# Altium footprint library pw.PcbLib: 210 footprints (part 5 of 14)
Each footprint in its own frame and in the unit in brackets; x right, y up, seen from the top. Pads: shape width x height; smd on the part's side, far side on the other; paste and mask are expansions set on the pad; w line width, h text height; cw(c..) or ccw(c..) is an arc to the next point about the centre after c.
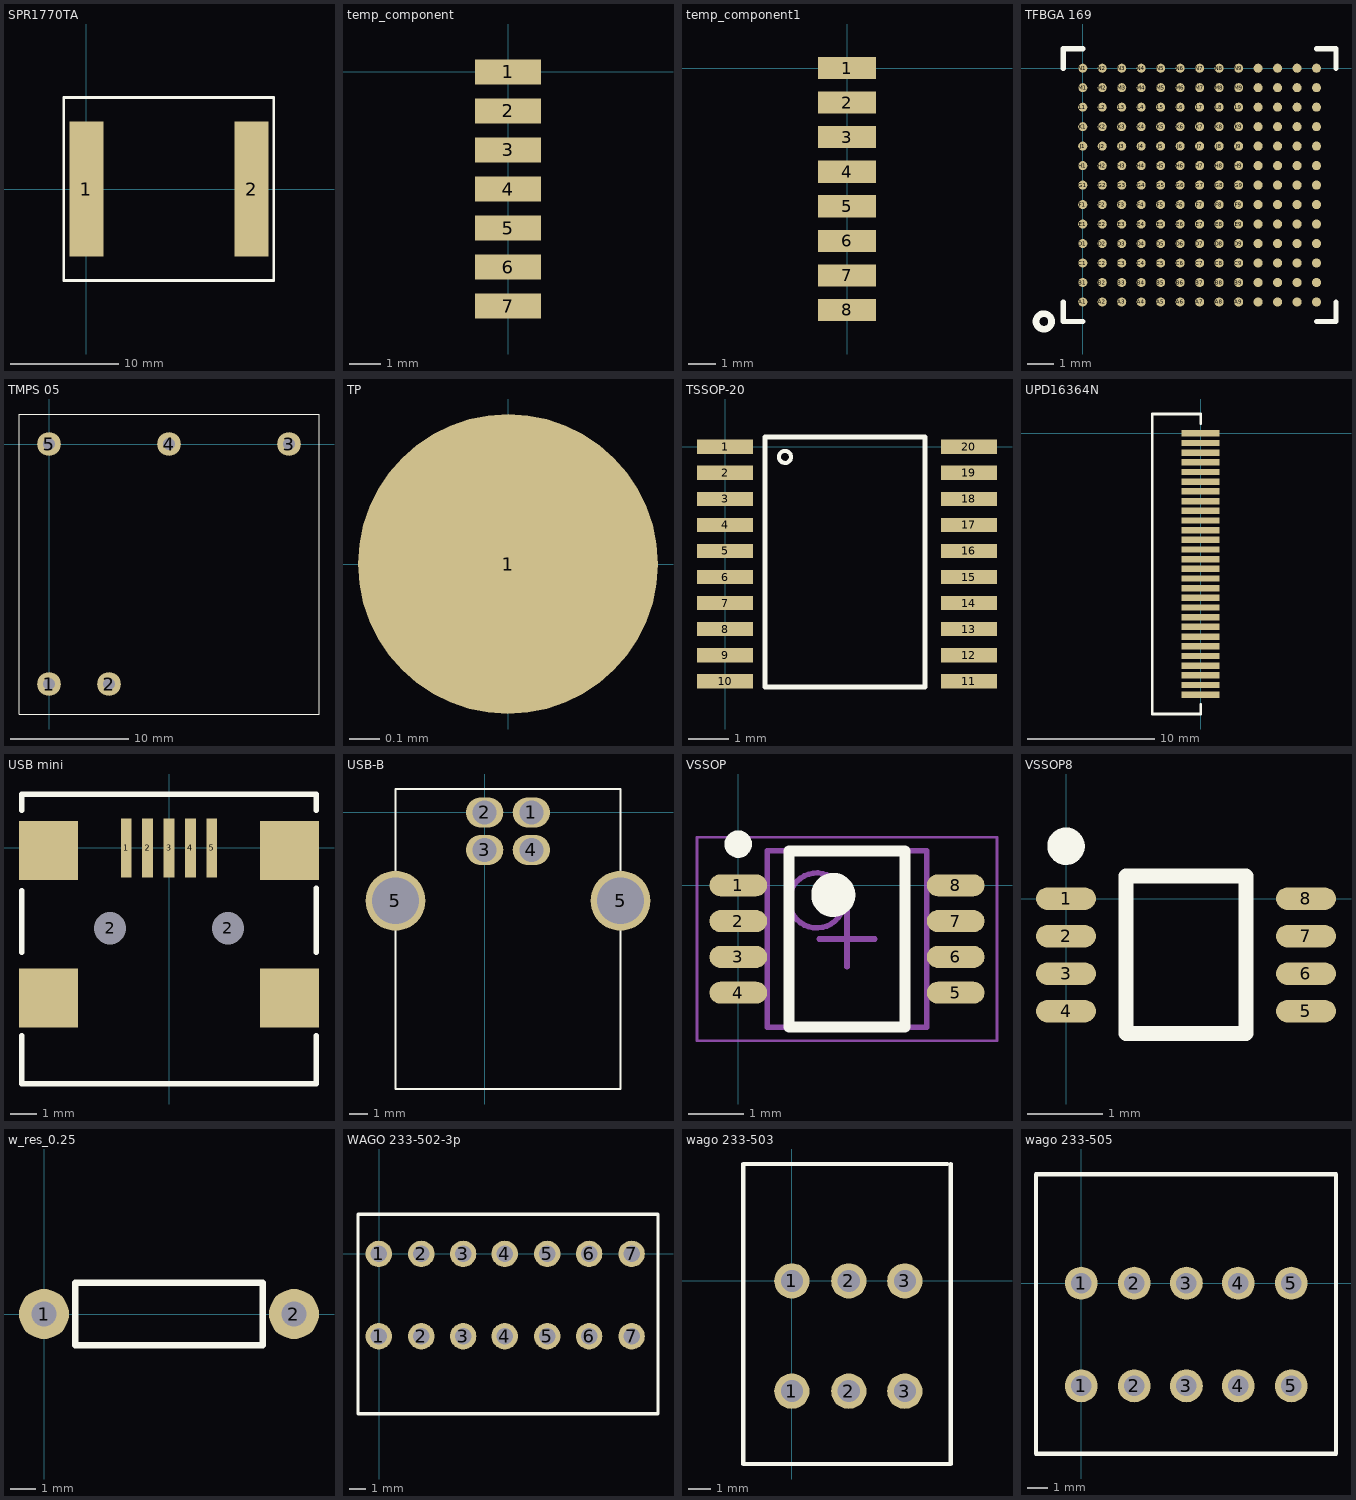
[diagram p4: the footprints below, top view; thin cyan lines are the x and y axes]

## SPR1770TA [mm] "inductor"
pads (2):
  rect 3.15x12.5 smd: 1(0,0) 2(15.35,0)
Top Overlay:
  lines w0.254: -2.1,-8.5 17.4,-8.5 17.4,8.5 -2.1,8.5 -2.1,-8.5
3D body "User Library-SRP1770TA.STEP": height 6.45, standoff -0.25, extent -1.1,-8.45 16.3,8.45

## temp_component [mm]
pads (7):
  rect 2.1x0.8 smd: 1(0,0) 2(0,-1.25) 3(0,-2.5) 4(0,-3.75) 5(0,-5) 6(0,-6.25) 7(0,-7.5)

## temp_component1 [mm]
pads (8):
  rect 2.1x0.8 smd: 1(0,0) 2(0,-1.25) 3(0,-2.5) 4(0,-3.75) 5(0,-5) 6(0,-6.25) 7(0,-7.5) 8(0,-8.75)

## TFBGA 169 [mm]
pads (169):
  round 0.35 smd: A1(0,-9) A2(0.75,-9) A3(1.5,-9) A4(2.25,-9) A5(3,-9) A6(3.75,-9) A7(4.5,-9) A8(5.25,-9) A9(6,-9) A10(6.75,-9) A11(7.5,-9) A12(8.25,-9) A13(9,-9) B1(0,-8.25) B2(0.75,-8.25) B3(1.5,-8.25) B4(2.25,-8.25) B5(3,-8.25) B6(3.75,-8.25) B7(4.5,-8.25) B8(5.25,-8.25) B9(6,-8.25) B10(6.75,-8.25) B11(7.5,-8.25) B12(8.25,-8.25) B13(9,-8.25) C1(0,-7.5) C2(0.75,-7.5) C3(1.5,-7.5) C4(2.25,-7.5) C5(3,-7.5) C6(3.75,-7.5) C7(4.5,-7.5) C8(5.25,-7.5) C9(6,-7.5) C10(6.75,-7.5) C11(7.5,-7.5) C12(8.25,-7.5) C13(9,-7.5) D1(0,-6.75) D2(0.75,-6.75) D3(1.5,-6.75) D4(2.25,-6.75) D5(3,-6.75) D6(3.75,-6.75) D7(4.5,-6.75) D8(5.25,-6.75) D9(6,-6.75) D10(6.75,-6.75) D11(7.5,-6.75) D12(8.25,-6.75) D13(9,-6.75) E1(0,-6) E2(0.75,-6) E3(1.5,-6) E4(2.25,-6) E5(3,-6) E6(3.75,-6) E7(4.5,-6) E8(5.25,-6) E9(6,-6) E10(6.75,-6) E11(7.5,-6) E12(8.25,-6) E13(9,-6) F1(0,-5.25) F2(0.75,-5.25) F3(1.5,-5.25) F4(2.25,-5.25) F5(3,-5.25) F6(3.75,-5.25) F7(4.5,-5.25) F8(5.25,-5.25) F9(6,-5.25) F10(6.75,-5.25) F11(7.5,-5.25) F12(8.25,-5.25) F13(9,-5.25) G1(0,-4.5) G2(0.75,-4.5) G3(1.5,-4.5) G4(2.25,-4.5) G5(3,-4.5) G6(3.75,-4.5) G7(4.5,-4.5) G8(5.25,-4.5) G9(6,-4.5) G10(6.75,-4.5) G11(7.5,-4.5) G12(8.25,-4.5) G13(9,-4.5) H1(0,-3.75) H2(0.75,-3.75) H3(1.5,-3.75) H4(2.25,-3.75) H5(3,-3.75) H6(3.75,-3.75) H7(4.5,-3.75) H8(5.25,-3.75) H9(6,-3.75) H10(6.75,-3.75) H11(7.5,-3.75) H12(8.25,-3.75) H13(9,-3.75) J1(0,-3) J2(0.75,-3) J3(1.5,-3) J4(2.25,-3) J5(3,-3) J6(3.75,-3) J7(4.5,-3) J8(5.25,-3) J9(6,-3) J10(6.75,-3) J11(7.5,-3) J12(8.25,-3) J13(9,-3) K1(0,-2.25) K2(0.75,-2.25) K3(1.5,-2.25) K4(2.25,-2.25) K5(3,-2.25) K6(3.75,-2.25) K7(4.5,-2.25) K8(5.25,-2.25) K9(6,-2.25) K10(6.75,-2.25) K11(7.5,-2.25) K12(8.25,-2.25) K13(9,-2.25) L1(0,-1.5) L2(0.75,-1.5) L3(1.5,-1.5) L4(2.25,-1.5) L5(3,-1.5) L6(3.75,-1.5) L7(4.5,-1.5) L8(5.25,-1.5) L9(6,-1.5) L10(6.75,-1.5) L11(7.5,-1.5) L12(8.25,-1.5) L13(9,-1.5) M1(0,-0.75) M2(0.75,-0.75) M3(1.5,-0.75) M4(2.25,-0.75) M5(3,-0.75) M6(3.75,-0.75) M7(4.5,-0.75) M8(5.25,-0.75) M9(6,-0.75) M10(6.75,-0.75) M11(7.5,-0.75) M12(8.25,-0.75) M13(9,-0.75) N1(0,0) N2(0.75,0) N3(1.5,0) N4(2.25,0) N5(3,0) N6(3.75,0) N7(4.5,0) N8(5.25,0) N9(6,0) N10(6.75,0) N11(7.5,0) N12(8.25,0) N13(9,0)
Top Overlay:
  circle w0.254: c-1.5,-9.75 r0.3
  lines w0.2: -0.75,-9 -0.75,-9.75 0,-9.75 ; -0.75,0 -0.75,0.75 0,0.75 ; 9,-9.75 9.75,-9.75 9.75,-9 ; 9,0.75 9.75,0.75 9.75,0
3D body: height 1, standoff 0, extent -0.5,-9.5 9.5,0.5

## TMPS 05 [mm] "AC/DC Traco"
pads (5):
  round 2 hole 1: 1(0,-20.32) 2(5.08,-20.32) 3(20.32,0) 4(10.16,0) 5(0,0)
Top Overlay:
  lines w0.1: -2.54,-22.86 -2.54,2.54 22.86,2.54 22.86,-22.86 -2.54,-22.86
3D body "User Library-TMPS03.STEP": height 16.31, standoff -5.08, extent -2.5,-22.9 22.9,2.5

## TP [mm]
pads (1):
  round 1 smd: 1(0,0)

## TSSOP-20 [mm]
pads (20):
  rect 1.4x0.36 smd: 1(0,0) 2(0,-0.65) 3(0,-1.3) 4(0,-1.95) 5(0,-2.6) 6(0,-3.25) 7(0,-3.9) 8(0,-4.55) 9(0,-5.2) 10(0,-5.85) 11(6.095,-5.85) 12(6.095,-5.2) 13(6.095,-4.55) 14(6.095,-3.9) 15(6.095,-3.25) 16(6.095,-2.6) 17(6.095,-1.95) 18(6.095,-1.3) 19(6.095,-0.65) 20(6.095,0)
Top Overlay:
  circle w0.1: c1.5,-0.25 r0.15
  lines w0.125: 1,-6 1,0.25 5,0.25 5,-6 1,-6
3D body "User Library-tssop-20-1.STEP": height 1.2, standoff 0, extent -0.3,-6.2 6.3,0.4

## UPD16364N [mm]
pads (28):
  rect 3x0.5 smd: 1(0,0) 2(0,-0.76) 3(0,-1.52) 4(0,-2.28) 5(0,-3.04) 6(0,-3.8) 7(0,-4.56) 8(0,-5.32) 9(0,-6.08) 10(0,-6.84) 11(0,-7.6) 12(0,-8.36) 13(0,-9.12) 14(0,-9.88) 15(0,-10.64) 16(0,-11.4) 17(0,-12.16) 18(0,-12.92) 19(0,-13.68) 20(0,-14.44) 21(0,-15.2) 22(0,-15.96) 23(0,-16.72) 24(0,-17.48) 25(0,-18.24) 26(0,-19) 27(0,-19.76) 28(0,-20.52)
Top Overlay:
  lines w0.2: 0,-21.28 0,-22.04 -3.8,-22.04 -3.8,1.52 0,1.52 0,0.76

## USB mini [mm]
pads (11):
  rect 0.4x2.2 smd: 1(-1.6,0) 2(-0.8,0) 3(0,0) 4(0.8,0) 5(1.6,0)
  round 0.8 hole 1.2: 2(-2.2,-3) 2(2.2,-3)
  rect 2.2x2.2 smd: ""(-4.5,-5.6) ""(-4.5,-0.1) ""(4.5,-5.6) ""(4.5,-0.1)
Top Overlay:
  lines w0.2: -5.5,-7 -5.5,-8.8 5.5,-8.8 5.5,-7 ; -5.5,-3.9 -5.5,-1.6 ; -5.5,1.4 -5.5,2 5.5,2 5.5,1.4 ; 5.5,-3.9 5.5,-1.5
3D body "2059755_1734035-2.stp": height 0.45, standoff -4.64, extent -4.95,-8.8 4.95,0.4

## USB-B [mm]
pads (6):
  oval 2x1.6 hole 1.3: 1(2.5,0) 2(0,0) 3(0,-2) 4(2.5,-2)
  round 3.2 hole 2.5: 5(-4.75,-4.71) 5(7.25,-4.71)
Top Overlay:
  lines w0.125: -4.75,-14.75 -4.75,1.25 7.25,1.25 7.25,-14.75 -4.75,-14.75
3D body "User Library-Samtec - USB-B-S-X-W-TH.STEP": height 11, standoff -3.64, extent -6.15,-14.95 8.648,1.55

## VSSOP [mm] "SOP, 8-Leads, Body 2,95x2,80mm, Pitch 0,65mm, IPC Medium Density"
height 2.65
pads (8):
  oval 1.05x0.4 smd: 1(0,0) 2(0,-0.65) 3(0,-1.3) 4(0,-1.95) 5(3.95,-1.95) 6(3.95,-1.3) 7(3.95,-0.65) 8(3.95,0)
Top Overlay:
  circle w0.4: c1.725,-0.175 r0.2
  circle w0.25: c0,0.75 r0.125
  lines w0.2: 0.925,-2.575 3.025,-2.575 3.025,0.625 0.925,0.625 0.925,-2.575
Mechanical 13:
  circle w0.1: c1.425,-0.275 r0.5
  lines w0.1: 0.525,-2.575 3.425,-2.575 3.425,0.625 0.525,0.625 0.525,-2.575
Mechanical 15:
  lines w0.05: -0.75,-2.825 4.7,-2.825 4.7,0.875 -0.75,0.875 -0.75,-2.825
  lines w0.1: 1.475,-0.975 2.475,-0.975 ; 1.975,-1.475 1.975,-0.475
3D body: height 2.65, standoff 0.25, extent 0.525,-2.575 3.425,0.625

## VSSOP8 [mm] "TSSOP, 8-Leads, Body 2,00x2,30mm, Pitch 0,50mm, IPC Medium Density"
height 0.9
pads (8):
  oval 0.8x0.3 smd: 1(0,0) 2(0,-0.5) 3(0,-1) 4(0,-1.5) 5(3.2,-1.5) 6(3.2,-1) 7(3.2,-0.5) 8(3.2,0)
Top Overlay:
  circle w0.25: c0,0.7 r0.125
  lines w0.2: 0.8,-1.8 0.8,0.3 2.4,0.3 2.4,-1.8 0.8,-1.8
3D body "User Library-VSSOP8-1.STEP": height 0.9, standoff 0, extent 0,-1.8 3.2,0.3

## w_res_0.25 [mm] "d1,s2,r10"
pads (2):
  round 2 hole 1: 1(0,0) 2(10,0)
Top Overlay:
  lines w0.254: 1.25,-1.25 1.25,1.25 8.75,1.25 8.75,-1.25 1.25,-1.25
3D body "RESAD1000W50L320D180_0.125W.STEP": height 3.9, standoff -0.5, extent -0.25,-0.9 10.25,0.9

## WAGO 233-502-3p [mm]
pads (14):
  round 1.6 hole 1: 1(-0.04,-5) 1(-0.04,0) 2(2.54,-5) 2(2.54,0) 3(5.08,-5) 3(5.08,0) 4(7.6,-5) 4(7.6,0) 5(10.18,-5) 5(10.18,0) 6(12.72,-5) 6(12.72,0) 7(15.3,-5) 7(15.3,0)
Top Overlay:
  lines w0.2: 6.34,-9.7 16.9,-9.7 16.9,2.4 10.14,2.4 6.34,2.4 ; 6.5,-9.7 -1.3,-9.7 -1.3,2.4 2.5,2.4 6.5,2.4
3D body "233-502.stp": height 16.44, standoff -4, extent 0.02,-9.824 7.4,2.5
3D body "233-502.stp": height 16.44, standoff -4, extent -2.72,-9.812 4.66,2.512
3D body "233-502.stp": height 16.44, standoff -4, extent 4.92,-9.812 12.3,2.512
3D body "233-502.stp": height 16.44, standoff -4, extent 7.66,-9.824 15.04,2.5
3D body "233-502.stp": height 16.44, standoff -4, extent 9.52,-9.812 16.9,2.512

## wago 233-503 [mm]
pads (6):
  round 1.6 hole 1: 1(0,-5) 1(0,0) 2(2.58,-5) 2(2.58,0) 3(5.12,-5) 3(5.12,0)
Top Overlay:
  lines w0.2: 7.04,5.3 3.04,5.3 -2.2,5.3 -2.2,-8.3 7.2,-8.3 7.2,5.3
3D body "233-503.stp": height 16.44, standoff -4, extent -2.22,-7.462 7.7,4.862

## wago 233-505 [mm]
pads (10):
  round 1.6 hole 1: 1(0,-5) 1(0,0) 2(2.58,-5) 2(2.58,0) 3(5.12,-5) 3(5.12,0) 4(7.64,-5) 4(7.64,0) 5(10.22,-5) 5(10.22,0)
Top Overlay:
  lines w0.2: 6.78,5.3 11.48,5.3 12.4,5.3 12.4,-8.3 10.22,-8.3 7.58,-8.3 -2.2,-8.3 -2.2,5.3 3.04,5.3 7.04,5.3
3D body "233-505.stp": height 16.44, standoff -4, extent -2.4,-7.6 12.6,4.724